# Altium footprint library My_PCB_6_28.PcbLib: 151 footprints (part 4 of 10)
Each footprint in its own frame and in the unit in brackets; x right, y up, seen from the top. Pads: shape width x height; smd on the part's side, far side on the other; paste and mask are expansions set on the pad; w line width, h text height; cw(c..) or ccw(c..) is an arc to the next point about the centre after c.
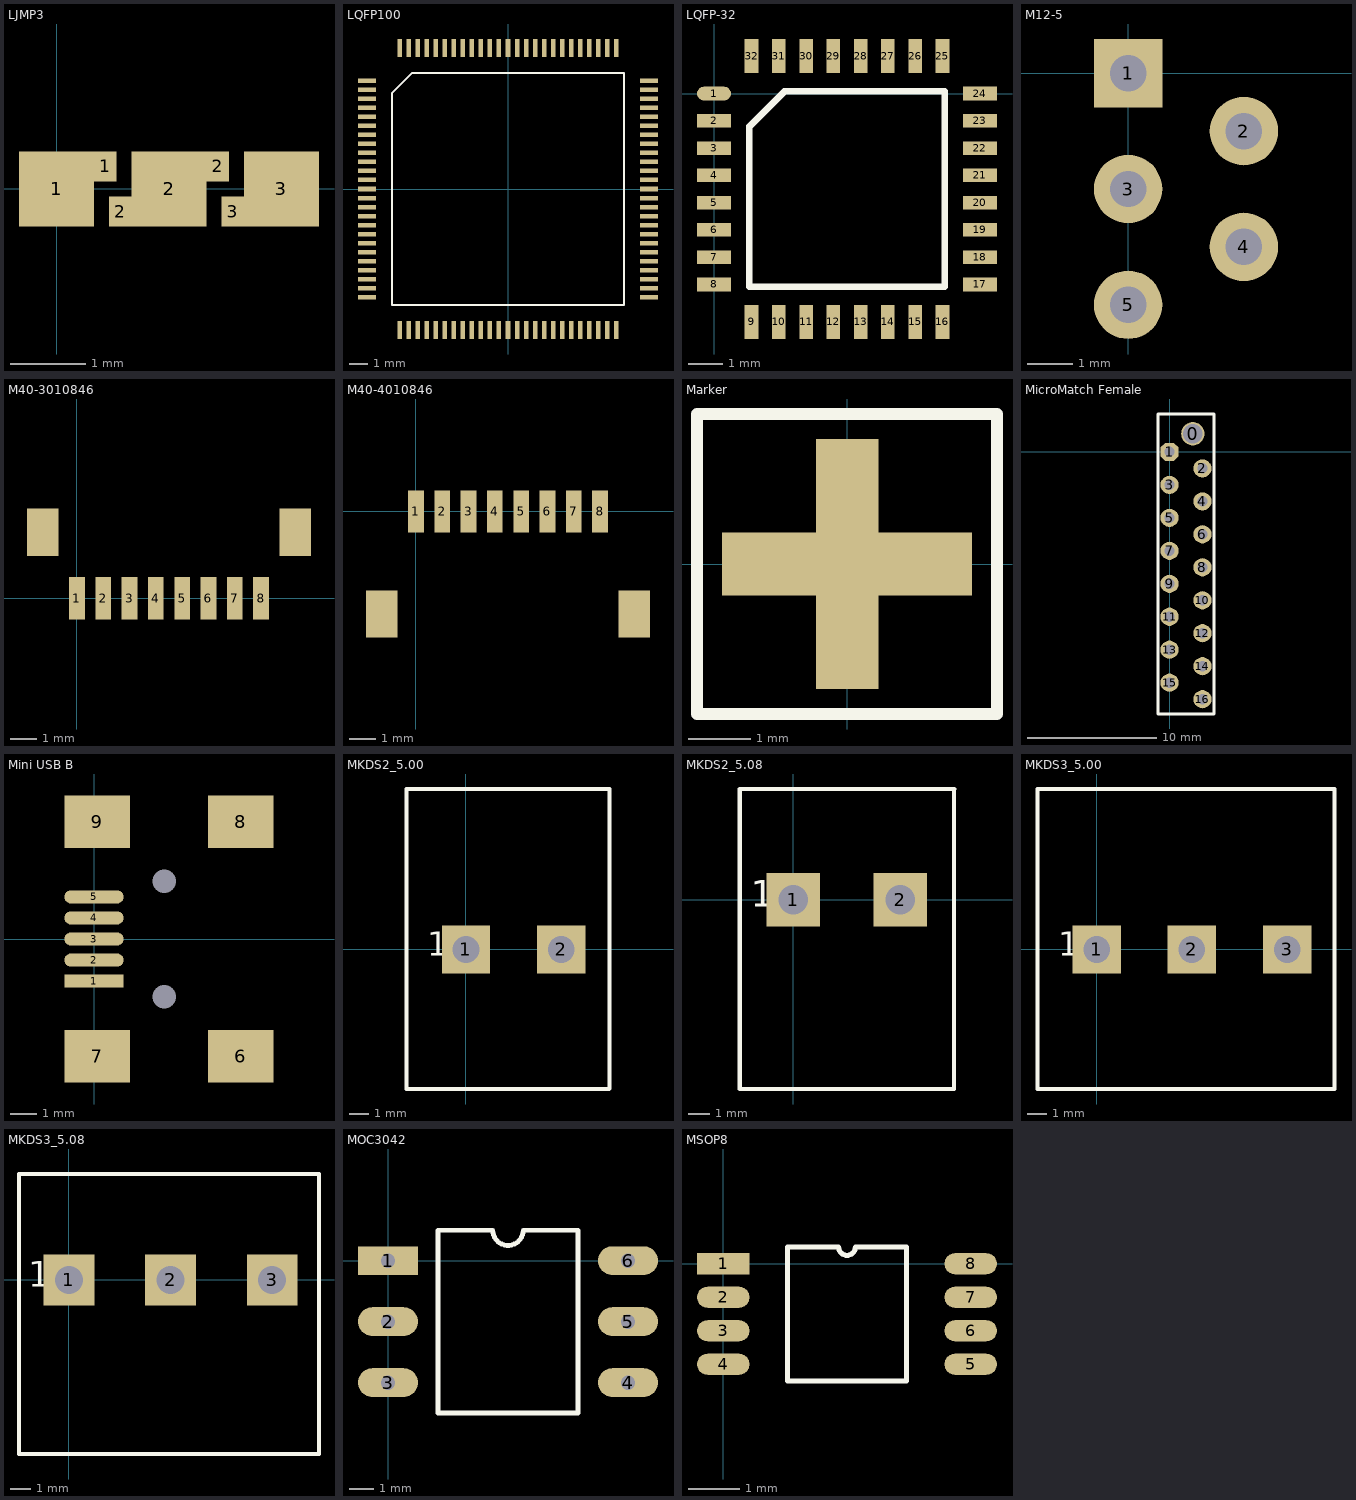
[diagram p3: the footprints below, top view; thin cyan lines are the x and y axes]

## LJMP3 [mm]
pads (7):
  rect 1x1 smd: 1(0,0) 2(1.5,0) 3(3,0)
  rect 0.3x0.4 smd: 1(0.65,0.3) 2(0.85,-0.3) 2(2.15,0.3) 3(2.35,-0.3)
Top Layer:
  lines w0.254: 0,0 0.3,0.3 0.65,0.3 ; 0.85,-0.3 1.2,-0.3 1.5,0 1.8,0.3 2.15,0.3 ; 2.35,-0.3 2.7,-0.3 3,0

## LQFP100 [mm]
pads (100):
  rect 1x0.25 smd: 1(-7.8,6) 2(-7.8,5.5) 3(-7.8,5) 4(-7.8,4.5) 5(-7.8,4) 6(-7.8,3.5) 7(-7.8,3) 8(-7.8,2.5) 9(-7.8,2) 10(-7.8,1.5) 11(-7.8,1) 12(-7.8,0.5) 13(-7.8,0) 14(-7.8,-0.5) 15(-7.8,-1) 16(-7.8,-1.5) 17(-7.8,-2) 18(-7.8,-2.5) 19(-7.8,-3) 20(-7.8,-3.5) 21(-7.8,-4) 22(-7.8,-4.5) 23(-7.8,-5) 24(-7.8,-5.5) 25(-7.8,-6) 51(7.8,-6) 52(7.8,-5.5) 53(7.8,-5) 54(7.8,-4.5) 55(7.8,-4) 56(7.8,-3.5) 57(7.8,-3) 58(7.8,-2.5) 59(7.8,-2) 60(7.8,-1.5) 61(7.8,-1) 62(7.8,-0.5) 63(7.8,0) 64(7.8,0.5) 65(7.8,1) 66(7.8,1.5) 67(7.8,2) 68(7.8,2.5) 69(7.8,3) 70(7.8,3.5) 71(7.8,4) 72(7.8,4.5) 73(7.8,5) 74(7.8,5.5) 75(7.8,6)
  rect 0.25x1 smd: 26(-6,-7.8) 27(-5.5,-7.8) 28(-5,-7.8) 29(-4.5,-7.8) 30(-4,-7.8) 31(-3.5,-7.8) 32(-3,-7.8) 33(-2.5,-7.8) 34(-2,-7.8) 35(-1.5,-7.8) 36(-1,-7.8) 37(-0.5,-7.8) 38(0,-7.8) 39(0.5,-7.8) 40(1,-7.8) 41(1.5,-7.8) 42(2,-7.8) 43(2.5,-7.8) 44(3,-7.8) 45(3.5,-7.8) 46(4,-7.8) 47(4.5,-7.8) 48(5,-7.8) 49(5.5,-7.8) 50(6,-7.8) 76(6,7.8) 77(5.5,7.8) 78(5,7.8) 79(4.5,7.8) 80(4,7.8) 81(3.5,7.8) 82(3,7.8) 83(2.5,7.8) 84(2,7.8) 85(1.5,7.8) 86(1,7.8) 87(0.5,7.8) 88(0,7.8) 89(-0.5,7.8) 90(-1,7.8) 91(-1.5,7.8) 92(-2,7.8) 93(-2.5,7.8) 94(-3,7.8) 95(-3.5,7.8) 96(-4,7.8) 97(-4.5,7.8) 98(-5,7.8) 99(-5.5,7.8) 100(-6,7.8)
Top Overlay:
  lines w0.1: -6.415,-6.415 -6.415,5.33 -5.33,6.415 6.415,6.415 6.415,-6.415 -6.415,-6.415
3D body: height 1.75, standoff 0, extent -8.024,-8.024 8.004,8.004

## LQFP-32 [mm]
height 7
pads (32):
  oval 1x0.4 smd: 1(0,0)
  rect 1x0.4 smd: 2(0,-0.8) 3(0,-1.6) 4(0,-2.4) 5(0,-3.2) 6(0,-4) 7(0,-4.8) 8(0,-5.6) 17(7.8,-5.6) 18(7.8,-4.8) 19(7.8,-4) 20(7.8,-3.2) 21(7.8,-2.4) 22(7.8,-1.6) 23(7.8,-0.8) 24(7.8,0)
  rect 0.4x1 smd: 9(1.1,-6.7) 10(1.9,-6.7) 11(2.7,-6.7) 12(3.5,-6.7) 13(4.3,-6.7) 14(5.1,-6.7) 15(5.9,-6.7) 16(6.7,-6.7) 25(6.7,1.1) 26(5.9,1.1) 27(5.1,1.1) 28(4.3,1.1) 29(3.5,1.1) 30(2.7,1.1) 31(1.9,1.1) 32(1.1,1.1)
Top Overlay:
  lines w0.2: 1.035,-5.665 1.035,-0.97 2.07,0.065 6.765,0.065 6.765,-5.665 1.035,-5.665

## M12-5 [mm]
pads (5):
  rect 1.5x1.5 hole 0.8: 1(0,0)
  round 1.5 hole 0.8: 2(2.54,-1.27) 3(0,-2.54) 4(2.54,-3.81) 5(0,-5.08)

## M40-3010846 [mm]
height 2.9
pads (10):
  rect 0.6x1.6 smd: 1(0,0) 2(1,0) 3(2,0) 4(3,0) 5(4,0) 6(5,0) 7(6,0) 8(7,0)
  rect 1.2x1.8 smd: ""(-1.3,2.5) ""(8.3,2.5)
3D body: height 4.25, standoff -0.05, extent -1.65,-0.375 8.65,3.225

## M40-4010846 [mm]
height 2.9
pads (10):
  rect 0.6x1.6 smd: 1(0,0) 2(1,0) 3(2,0) 4(3,0) 5(4,0) 6(5,0) 7(6,0) 8(7,0)
  rect 1.2x1.8 smd: ""(-1.3,-3.9) ""(8.3,-3.9)
3D body: height 2.93, standoff 0.03, extent -1.65,-4.65 8.65,0.35

## Marker [mm]
pads (2):
  rect 4x1 smd paste-1 mask-1: ""(0,0)
  rect 1x4 smd paste-1 mask-1: ""(0,0)
Top Overlay:
  lines w0.2: -2.4,-2.4 -2.4,2.4 2.4,2.4 2.4,-2.4 -2.4,-2.4

## MicroMatch Female [mm]
height 4
pads (17):
  round 1.8 hole 1.5: 0(1.8,1.4)
  oct 1.4x1.4 hole 0.8: 1(0,0)
  round 1.4 hole 0.8: 2(2.54,-1.27) 3(0,-2.54) 4(2.54,-3.81) 5(0,-5.08) 6(2.54,-6.35) 7(0,-7.62) 8(2.54,-8.89) 9(0,-10.16) 10(2.54,-11.43) 11(0,-12.7) 12(2.54,-13.97) 13(0,-15.24) 14(2.54,-16.51) 15(0,-17.78) 16(2.54,-19.05)
Top Overlay:
  lines w0.2: -0.889,-20.193 3.429,-20.193 3.429,2.921 -0.889,2.921 -0.889,-20.193

## Mini USB B [mm]
pads (11):
  rect 2.25x0.5 smd: 1(0,-1.6)
  oval 2.25x0.5 smd: 2(0,-0.8) 3(0,0) 4(0,0.8) 5(0,1.6)
  rect 2.5x2 smd: 6(5.575,-4.45) 7(0.125,-4.45) 8(5.575,4.45) 9(0.125,4.45)
  round 0.8 hole 0.9: ""(2.675,-2.2) ""(2.675,2.2)
3D body: height 4.05, standoff 0, extent 0,-4.95 9,4.95

## MKDS2_5.00 [mm]
height 20
pads (2):
  rect 2.54x2.54 hole 1.4: 1(0,0) 2(5,0)
Top Overlay:
  lines w0.203: 7.5,8.43 -3.12,8.43 -3.12,-7.33 7.51,-7.33 7.54,-7.3 7.54,8.43
  text "1" at -2.032,-0.343 h1.27
3D body: height 18.1, standoff -4.4, extent -3.26,-7.49 7.48,8.507

## MKDS2_5.08 [mm]
height 20
pads (2):
  rect 2.54x2.54 hole 1.4: 1(0,0) 2(5.08,0)
Top Overlay:
  lines w0.203: -2.54,5.25 -2.54,-8.98 7.62,-8.98 7.62,5.25 ; -2.49,5.25 7.63,5.25
  text "1" at -2.032,-0.343 h1.27
3D body: height 19.8, standoff -3.4, extent -2.58,-9 7.58,5.25

## MKDS3_5.00 [mm]
height 20
pads (3):
  rect 2.54x2.54 hole 1.4: 1(0,0) 2(5,0) 3(10,0)
Top Overlay:
  lines w0.203: -3.12,-7.33 12.5,-7.33 12.5,8.43 -3.12,8.43 -3.12,-7.33
  text "1" at -2.032,-0.343 h1.27
3D body: height 18.1, standoff -4.4, extent -3.271,-7.45 12.471,8.547

## MKDS3_5.08 [mm]
height 20
pads (3):
  rect 2.54x2.54 hole 1.4: 1(0,0) 2(5.08,0) 3(10.16,0)
Top Overlay:
  lines w0.203: -2.5,-8.71 12.5,-8.71 12.5,5.3 -2.5,5.3 -2.5,-8.71
  text "1" at -2.032,-0.343 h1.27
3D body: height 19.8, standoff -3.4, extent -2.62,-8.84 12.62,5.41

## MOC3042 [mm]
height 8
pads (6):
  rect 2.5x1.2 hole 0.6: 1(0,0)
  oval 2.5x1.2 hole 0.6: 2(0,-2.54) 3(0,-5.08) 4(10,-5.08) 5(10,-2.54) 6(10,0)
Top Overlay:
  lines w0.2: 2.085,-6.35 2.085,1.27 4.365,1.27 ccw(c5,1.27) 5.635,1.27 7.915,1.27 7.915,-6.35 2.085,-6.35

## Molex 51021-0600 [mm]
3D body: height 2, standoff -1.2, extent -1266.625,-1270.475 -1257.375,-1266.525

## MSOP8 [mm]
pads (8):
  rect 1.02x0.41 smd: 1(0,0)
  oval 1.02x0.41 smd: 2(0,-0.65) 3(0,-1.3) 4(0,-1.95) 5(4.8,-1.95) 6(4.8,-1.3) 7(4.8,-0.65) 8(4.8,0)
Top Overlay:
  lines w0.1: 1.245,-2.275 1.245,0.325 2.238,0.325 ccw(c2.4,0.325) 2.562,0.325 3.555,0.325 3.555,-2.275 1.245,-2.275
3D body: height 1.1, standoff 0, extent -0.069,-2.55 4.869,0.55